# Altium footprint library SpaceVNX.PcbLib: 61 footprints (part 2 of 4)
Each footprint in its own frame and in the unit in brackets; x right, y up, seen from the top. Pads: shape width x height; smd on the part's side, far side on the other; paste and mask are expansions set on the pad; w line width, h text height; cw(c..) or ccw(c..) is an arc to the next point about the centre after c.
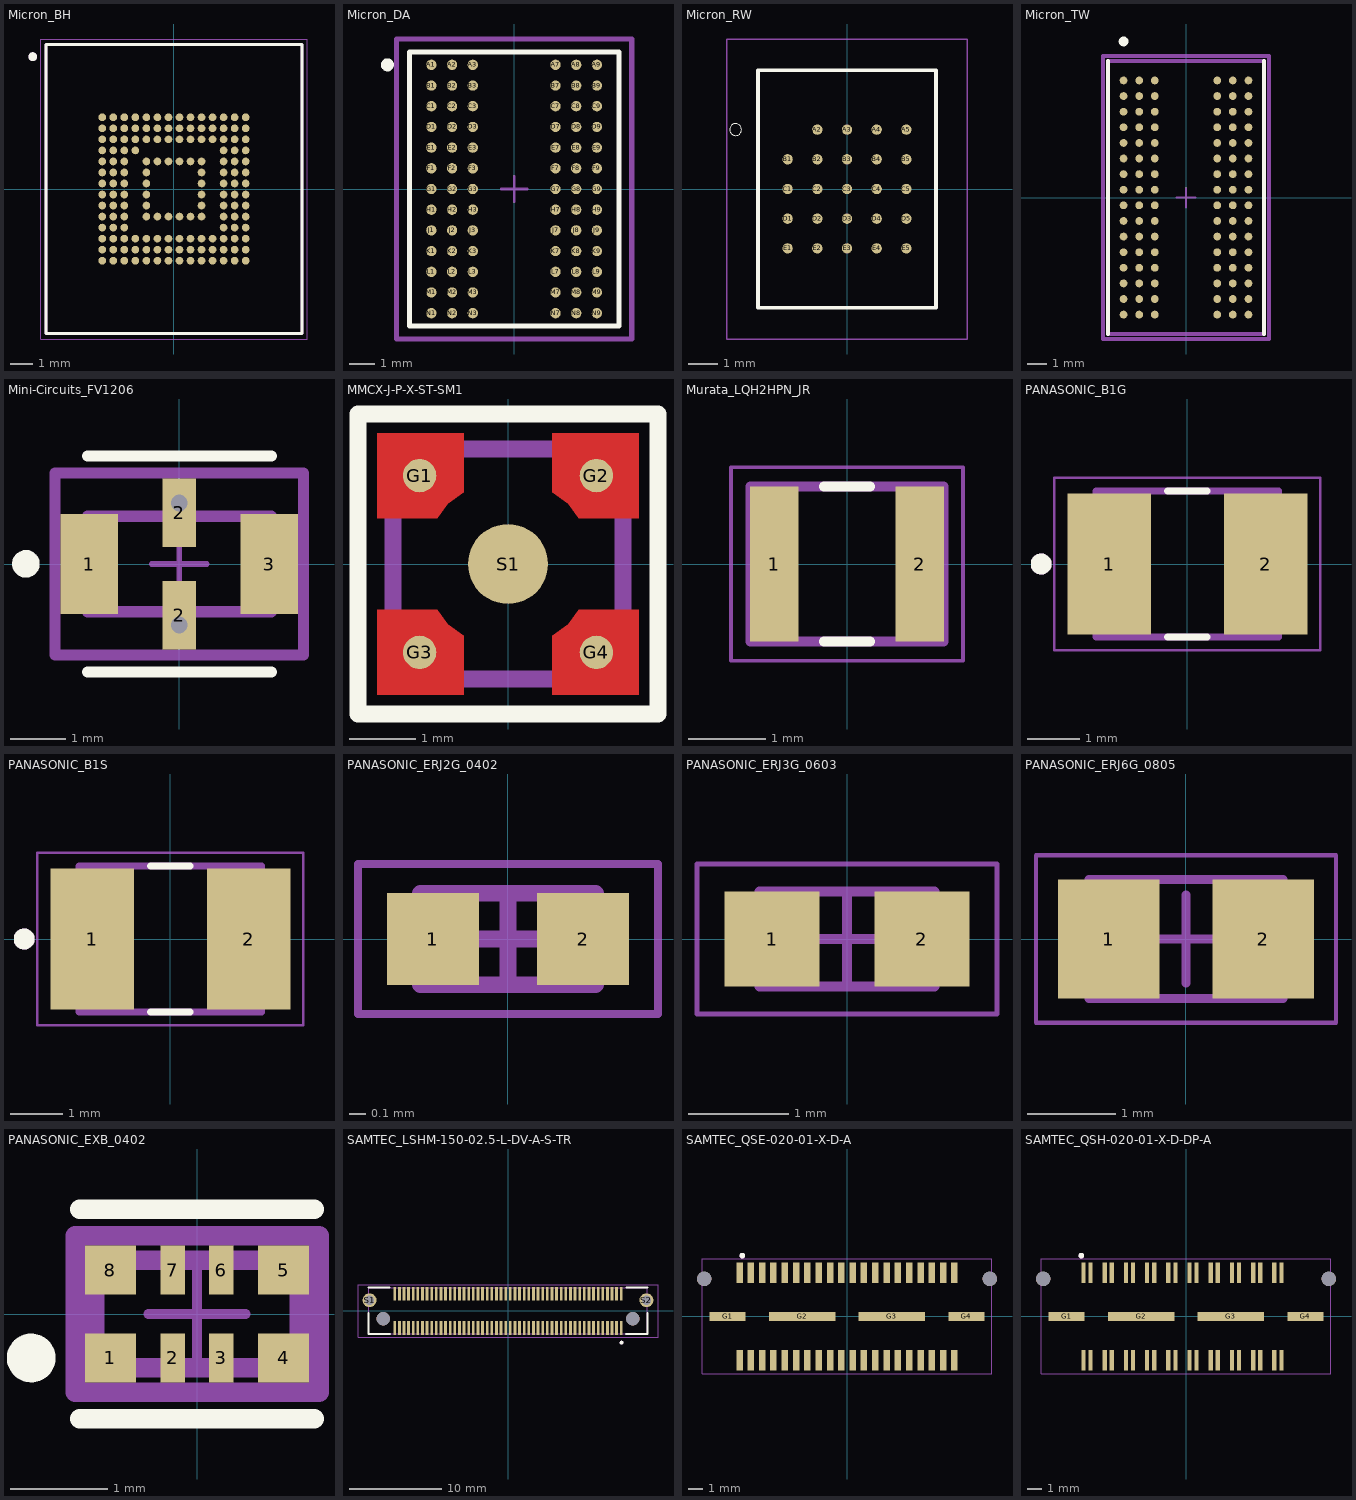
[diagram p1: the footprints below, top view; thin cyan lines are the x and y axes]

## Micron_BH [mm] "153-Ball TFBGA 11.5 x 13 mm"
pads (153):
  round 0.35 smd: A1(-3.25,3.25) A2(-2.75,3.25) A3(-2.25,3.25) A4(-1.75,3.25) A5(-1.25,3.25) A6(-0.75,3.25) A7(-0.25,3.25) A8(0.25,3.25) A9(0.75,3.25) A10(1.25,3.25) A11(1.75,3.25) A12(2.25,3.25) A13(2.75,3.25) A14(3.25,3.25) B1(-3.25,2.75) B2(-2.75,2.75) B3(-2.25,2.75) B4(-1.75,2.75) B5(-1.25,2.75) B6(-0.75,2.75) B7(-0.25,2.75) B8(0.25,2.75) B9(0.75,2.75) B10(1.25,2.75) B11(1.75,2.75) B12(2.25,2.75) B13(2.75,2.75) B14(3.25,2.75) C1(-3.25,2.25) C2(-2.75,2.25) C3(-2.25,2.25) C4(-1.75,2.25) C5(-1.25,2.25) C6(-0.75,2.25) C7(-0.25,2.25) C8(0.25,2.25) C9(0.75,2.25) C10(1.25,2.25) C11(1.75,2.25) C12(2.25,2.25) C13(2.75,2.25) C14(3.25,2.25) D1(-3.25,1.75) D2(-2.75,1.75) D3(-2.25,1.75) D4(-1.75,1.75) D12(2.25,1.75) D13(2.75,1.75) D14(3.25,1.75) E1(-3.25,1.25) E2(-2.75,1.25) E3(-2.25,1.25) E5(-1.25,1.25) E6(-0.75,1.25) E7(-0.25,1.25) E8(0.25,1.25) E9(0.75,1.25) E10(1.25,1.25) E12(2.25,1.25) E13(2.75,1.25) E14(3.25,1.25) F1(-3.25,0.75) F2(-2.75,0.75) F3(-2.25,0.75) F5(-1.25,0.75) F10(1.25,0.75) F12(2.25,0.75) F13(2.75,0.75) F14(3.25,0.75) G1(-3.25,0.25) G2(-2.75,0.25) G3(-2.25,0.25) G5(-1.25,0.25) G10(1.25,0.25) G12(2.25,0.25) G13(2.75,0.25) G14(3.25,0.25) H1(-3.25,-0.25) H2(-2.75,-0.25) H3(-2.25,-0.25) H5(-1.25,-0.25) H10(1.25,-0.25) H12(2.25,-0.25) H13(2.75,-0.25) H14(3.25,-0.25) J1(-3.25,-0.75) J2(-2.75,-0.75) J3(-2.25,-0.75) J5(-1.25,-0.75) J10(1.25,-0.75) J12(2.25,-0.75) J13(2.75,-0.75) J14(3.25,-0.75) K1(-3.25,-1.25) K2(-2.75,-1.25) K3(-2.25,-1.25) K5(-1.25,-1.25) K6(-0.75,-1.25) K7(-0.25,-1.25) K8(0.25,-1.25) K9(0.75,-1.25) K10(1.25,-1.25) K12(2.25,-1.25) K13(2.75,-1.25) K14(3.25,-1.25) L1(-3.25,-1.75) L2(-2.75,-1.75) L3(-2.25,-1.75) L12(2.25,-1.75) L13(2.75,-1.75) L14(3.25,-1.75) M1(-3.25,-2.25) M2(-2.75,-2.25) M3(-2.25,-2.25) M4(-1.75,-2.25) M5(-1.25,-2.25) M6(-0.75,-2.25) M7(-0.25,-2.25) M8(0.25,-2.25) M9(0.75,-2.25) M10(1.25,-2.25) M11(1.75,-2.25) M12(2.25,-2.25) M13(2.75,-2.25) M14(3.25,-2.25) N1(-3.25,-2.75) N2(-2.75,-2.75) N3(-2.25,-2.75) N4(-1.75,-2.75) N5(-1.25,-2.75) N6(-0.75,-2.75) N7(-0.25,-2.75) N8(0.25,-2.75) N9(0.75,-2.75) N10(1.25,-2.75) N11(1.75,-2.75) N12(2.25,-2.75) N13(2.75,-2.75) N14(3.25,-2.75) P1(-3.25,-3.25) P2(-2.75,-3.25) P3(-2.25,-3.25) P4(-1.75,-3.25) P5(-1.25,-3.25) P6(-0.75,-3.25) P7(-0.25,-3.25) P8(0.25,-3.25) P9(0.75,-3.25) P10(1.25,-3.25) P11(1.75,-3.25) P12(2.25,-3.25) P13(2.75,-3.25) P14(3.25,-3.25)
Top Overlay:
  circle w0.2: c-6.4,6 r0.1
  lines w0.127: -5.8,-6.55 -5.8,6.55 5.8,6.55 5.8,-6.55 -5.8,-6.55
Mechanical 13:
  circle w0.2: c-6.4,6 r0.1
  lines w0.127: -5.8,-6.55 -5.8,6.55 5.8,6.55 5.8,-6.55 -5.8,-6.55
Mechanical 15:
  lines w0.05: -6.05,-6.8 -6.05,6.8 6.05,6.8 6.05,-6.8 -6.05,-6.8
3D body "MICRON_BH.stp": height 0.85, standoff -0.25, extent -5.75,-6.5 5.75,6.5

## Micron_DA [mm] "78-Ball FBGA 8 x 10 mm"
pads (78):
  round 0.399 smd paste+0 mask+0: A1(-3.2,4.8) A2(-2.4,4.8) A3(-1.6,4.8) A7(1.6,4.8) A8(2.4,4.8) A9(3.2,4.8) B1(-3.2,4) B2(-2.4,4) B3(-1.6,4) B7(1.6,4) B8(2.4,4) B9(3.2,4) C1(-3.2,3.2) C2(-2.4,3.2) C3(-1.6,3.2) C7(1.6,3.2) C8(2.4,3.2) C9(3.2,3.2) D1(-3.2,2.4) D2(-2.4,2.4) D3(-1.6,2.4) D7(1.6,2.4) D8(2.4,2.4) D9(3.2,2.4) E1(-3.2,1.6) E2(-2.4,1.6) E3(-1.6,1.6) E7(1.6,1.6) E8(2.4,1.6) E9(3.2,1.6) F1(-3.2,0.8) F2(-2.4,0.8) F3(-1.6,0.8) F7(1.6,0.8) F8(2.4,0.8) F9(3.2,0.8) G1(-3.2,0) G2(-2.4,0) G3(-1.6,0) G7(1.6,0) G8(2.4,0) G9(3.2,0) H1(-3.2,-0.8) H2(-2.4,-0.8) H3(-1.6,-0.8) H7(1.6,-0.8) H8(2.4,-0.8) H9(3.2,-0.8) J1(-3.2,-1.6) J2(-2.4,-1.6) J3(-1.6,-1.6) J7(1.6,-1.6) J8(2.4,-1.6) J9(3.2,-1.6) K1(-3.2,-2.4) K2(-2.4,-2.4) K3(-1.6,-2.4) K7(1.6,-2.4) K8(2.4,-2.4) K9(3.2,-2.4) L1(-3.2,-3.2) L2(-2.4,-3.2) L3(-1.6,-3.2) L7(1.6,-3.2) L8(2.4,-3.2) L9(3.2,-3.2) M1(-3.2,-4) M2(-2.4,-4) M3(-1.6,-4) M7(1.6,-4) M8(2.4,-4) M9(3.2,-4) N1(-3.2,-4.8) N2(-2.4,-4.8) N3(-1.6,-4.8) N7(1.6,-4.8) N8(2.4,-4.8) N9(3.2,-4.8)
Top Overlay:
  circle w0.25: c-4.9,4.8 r0.125
  lines w0.2: -4.05,-5.3 -4.05,5.3 4.05,5.3 4.05,-5.3 -4.05,-5.3
Mechanical 10:
  lines w0.2: -4.55,-5.8 -4.55,5.8 4.55,5.8 4.55,-5.8 -4.55,-5.8
  text ".Designator" at 0,0 h1
Mechanical 12:
  lines w0.15: -4.05,-5.3 -4.05,5.3 4.05,5.3 4.05,-5.3 -4.05,-5.3
Mechanical 15:
  lines w0.1: -0.5,0 0.5,0 ; 0,-0.5 0,0.5
  lines w0.2: -4.55,-5.8 -4.55,5.8 4.55,5.8 4.55,-5.8 -4.55,-5.8
3D body "MICRON_DA.stp": height 1.07, standoff -0.15, extent -3.986,-5.253 4.014,5.247

## Micron_RW [mm] "24-Ball T-PBGA 6 x 8mm"
pads (24):
  round 0.35 smd: A2(-1,2) A3(0,2) A4(1,2) A5(2,2) B1(-2,1) B2(-1,1) B3(0,1) B4(1,1) B5(2,1) C1(-2,0) C2(-1,0) C3(0,0) C4(1,0) C5(2,0) D1(-2,-1) D2(-1,-1) D3(0,-1) D4(1,-1) D5(2,-1) E1(-2,-2) E2(-1,-2) E3(0,-2) E4(1,-2) E5(2,-2)
Top Overlay:
  circle w0: c-3.75,2 r0.2
  lines w0.127: -3,-4 3,-4 3,4 -3,4 -3,-4
Mechanical 15:
  lines w0.05: -4.05,-5.05 4.05,-5.05 4.05,5.05 -4.05,5.05 -4.05,-5.05
3D body "MICRON_RW.stp": height 1.1, standoff -0.1, extent -3,-4 3,4

## Micron_TW [mm] "96-Ball FBGA 8mm x 14 mm"
pads (96):
  round 0.399 smd paste+0 mask+0: A1(-3.2,6) A2(-2.4,6) A3(-1.6,6) A7(1.6,6) A8(2.4,6) A9(3.2,6) B1(-3.2,5.2) B2(-2.4,5.2) B3(-1.6,5.2) B7(1.6,5.2) B8(2.4,5.2) B9(3.2,5.2) C1(-3.2,4.4) C2(-2.4,4.4) C3(-1.6,4.4) C7(1.6,4.4) C8(2.4,4.4) C9(3.2,4.4) D1(-3.2,3.6) D2(-2.4,3.6) D3(-1.6,3.6) D7(1.6,3.6) D8(2.4,3.6) D9(3.2,3.6) E1(-3.2,2.8) E2(-2.4,2.8) E3(-1.6,2.8) E7(1.6,2.8) E8(2.4,2.8) E9(3.2,2.8) F1(-3.2,2) F2(-2.4,2) F3(-1.6,2) F7(1.6,2) F8(2.4,2) F9(3.2,2) G1(-3.2,1.2) G2(-2.4,1.2) G3(-1.6,1.2) G7(1.6,1.2) G8(2.4,1.2) G9(3.2,1.2) H1(-3.2,0.4) H2(-2.4,0.4) H3(-1.6,0.4) H7(1.6,0.4) H8(2.4,0.4) H9(3.2,0.4) J1(-3.2,-0.4) J2(-2.4,-0.4) J3(-1.6,-0.4) J7(1.6,-0.4) J8(2.4,-0.4) J9(3.2,-0.4) K1(-3.2,-1.2) K2(-2.4,-1.2) K3(-1.6,-1.2) K7(1.6,-1.2) K8(2.4,-1.2) K9(3.2,-1.2) L1(-3.2,-2) L2(-2.4,-2) L3(-1.6,-2) L7(1.6,-2) L8(2.4,-2) L9(3.2,-2) M1(-3.2,-2.8) M2(-2.4,-2.8) M3(-1.6,-2.8) M7(1.6,-2.8) M8(2.4,-2.8) M9(3.2,-2.8) N1(-3.2,-3.6) N2(-2.4,-3.6) N3(-1.6,-3.6) N7(1.6,-3.6) N8(2.4,-3.6) N9(3.2,-3.6) P1(-3.2,-4.4) P2(-2.4,-4.4) P3(-1.6,-4.4) P7(1.6,-4.4) P8(2.4,-4.4) P9(3.2,-4.4) R1(-3.2,-5.2) R2(-2.4,-5.2) R3(-1.6,-5.2) R7(1.6,-5.2) R8(2.4,-5.2) R9(3.2,-5.2) T1(-3.2,-6) T2(-2.4,-6) T3(-1.6,-6) T7(1.6,-6) T8(2.4,-6) T9(3.2,-6)
Top Overlay:
  circle w0.25: c-3.2,8 r0.125
  lines w0.2: -4,-7 -4,7 ; 4,-7 4,7
Mechanical 10:
  lines w0.2: -4.25,-7.25 4.25,-7.25 4.25,7.25 -4.25,7.25 -4.25,-7.25
  text ".Designator" at -4.318,-7.112 h1
Mechanical 12:
  lines w0.2: -4,-7 4,-7 4,7 -4,7 -4,-7
Mechanical 15:
  lines w0.1: -0.5,0 0.5,0 ; 0,-0.5 0,0.5
  lines w0.2: -4.25,-7.25 4.25,-7.25 4.25,7.25 -4.25,7.25 -4.25,-7.25
3D body "MICRON_TW.stp": height 1.21, standoff -0.09, extent -4,-7 4,7

## Mini-Circuits_FV1206 [mil] "3.2 X 1.6 mm Ceramic Body, 0.94 mm Height"
pads (4):
  rect 41x71 smd paste+0 mask+0: 1(-64,0) 3(64,0)
  rect 24x49 smd paste+0 mask+0: 2(0,-36.5) 2(0,36.5)
via 0,-43.5 diameter 24 hole 12
via 0,43.5 diameter 24 hole 12
Top Overlay:
  circle w9.84: c-109.26,0.07 r4.92
  lines w7.87: -65.5,-76.77 65.5,-76.77 ; -65.5,76.77 65.5,76.77
Mechanical 10:
  lines w7.87: -88.44,-64.94 -88.44,64.94 88.44,64.94 88.44,-64.94 -88.44,-64.94
  text ".Designator" at 0,7.39 h39.37
Mechanical 12:
  lines w7.87: -65.5,-34 -65.5,34 65.5,34 65.5,-34 -65.5,-34
Mechanical 15:
  lines w3.94: -19.68,0 19.68,0 ; 0,-19.68 0,19.68
  lines w7.87: -88.44,-64.94 -88.44,64.94 88.44,64.94 88.44,-64.94 -88.44,-64.94
3D body "Filter_Mini-Circuits_LFCN-2500+_eec.STEP": height 10, standoff 0, extent -88.44,-64.94 88.44,64.94

## MMCX-J-P-X-ST-SM1 [mm]
pads (5):
  round 0.5 smd: G1(-1.325,1.325) G2(1.325,1.325) G3(-1.325,-1.325) G4(1.325,-1.325)
  round 1.2 smd mask+0.05: S1(0,0)
Top Layer:
  region: -1.059,0.688 -1.962,0.688 -1.962,1.962 -0.663,1.962 -0.667,1.08 -0.901,0.901 -1.062,0.69
  region: 1.059,0.688 1.962,0.688 1.962,1.962 0.663,1.962 0.667,1.08 0.901,0.901 1.062,0.69
  region: -1.059,-0.688 -1.962,-0.688 -1.962,-1.962 -0.663,-1.962 -0.667,-1.08 -0.901,-0.901 -1.062,-0.69
  region: 1.059,-0.688 1.962,-0.688 1.962,-1.962 0.663,-1.962 0.667,-1.08 0.901,-0.901 1.062,-0.69
Top Overlay:
  lines w0.254: -2.25,-2.25 2.25,-2.25 2.25,2.25 -2.25,2.25 -2.25,-2.25
Top Paste:
  region: -1.059,0.688 -1.962,0.688 -1.962,1.962 -0.663,1.962 -0.667,1.08 -0.901,0.901 -1.062,0.69
  region: 1.059,0.688 1.962,0.688 1.962,1.962 0.663,1.962 0.667,1.08 0.901,0.901 1.062,0.69
  region: -1.059,-0.688 -1.962,-0.688 -1.962,-1.962 -0.663,-1.962 -0.667,-1.08 -0.901,-0.901 -1.062,-0.69
  region: 1.059,-0.688 1.962,-0.688 1.962,-1.962 0.663,-1.962 0.667,-1.08 0.901,-0.901 1.062,-0.69
Top Solder:
  region: -1.017,0.613 -2.037,0.613 -2.037,2.037 -0.588,2.037 -0.593,1.04 -0.599,1.037 -0.847,0.847 -1.025,0.616
  region: 1.017,0.613 2.037,0.613 2.037,2.037 0.588,2.037 0.593,1.04 0.599,1.037 0.847,0.847 1.025,0.616
  region: -1.017,-0.613 -2.037,-0.613 -2.037,-2.037 -0.588,-2.037 -0.593,-1.04 -0.599,-1.037 -0.847,-0.847 -1.025,-0.616
  region: 1.017,-0.613 2.037,-0.613 2.037,-2.037 0.588,-2.037 0.593,-1.04 0.599,-1.037 0.847,-0.847 1.025,-0.616
Mechanical 1:
  lines w0.254: -1.725,-1.725 1.725,-1.725 1.725,1.725 -1.725,1.725 -1.725,-1.725
  text "J1" at -0.37,-0.377 h0.5
3D body "MMCX-J-P-H-ST-SM1.stp": height 5, standoff 0, extent -1.725,-1.75 1.725,1.75

## Murata_LQH2HPN_JR [mm] "1008 (2520)"
pads (2):
  rect 0.625x2 smd: 1(-0.937,0) 2(0.937,0)
Top Overlay:
  lines w0.127: -0.3,-1 0.3,-1 ; -0.3,1 0.3,1
Mechanical 13:
  lines w0.127: -1.25,-1 1.25,-1 1.25,1 -1.25,1 -1.25,-1
Mechanical 15:
  lines w0.05: -1.5,-1.25 1.5,-1.25 1.5,1.25 -1.5,1.25 -1.5,-1.25
3D body "LQH2HP_J0.stp": height 1.1, standoff 0, extent -1.25,-1 1.25,1

## PANASONIC_B1G [mm]
pads (2):
  rect 1.6x2.7 smd: 1(-1.5,0) 2(1.5,0)
Top Overlay:
  circle w0.2: c-2.8,0 r0.1
  lines w0.127: -0.38,-1.4 0.38,-1.4 ; -0.38,1.4 0.38,1.4
Mechanical 13:
  circle w0.2: c-2.8,0 r0.1
  lines w0.127: -1.75,-1.4 1.75,-1.4 1.75,1.4 -1.75,1.4 -1.75,-1.4
Mechanical 15:
  lines w0.05: -2.55,-1.65 2.55,-1.65 2.55,1.65 -2.55,1.65 -2.55,-1.65
3D body "B1G.stp": height 1.05, standoff -0.05, extent -1.778,-1.4 1.722,1.4

## PANASONIC_B1S [mm]
pads (2):
  rect 1.6x2.7 smd: 1(-1.5,0) 2(1.5,0)
Top Overlay:
  circle w0.2: c-2.8,0 r0.1
  lines w0.127: -0.38,-1.4 0.38,-1.4 ; -0.38,1.4 0.38,1.4
Mechanical 13:
  circle w0.2: c-2.8,0 r0.1
  lines w0.127: -1.75,-1.4 -1.75,1.4 1.75,1.4 1.75,-1.4 -1.75,-1.4
Mechanical 15:
  lines w0.05: -2.55,-1.65 -2.55,1.65 2.55,1.65 2.55,-1.65 -2.55,-1.65
3D body "B1S.stp": height 1.05, standoff -0.05, extent -1.75,-1.4 1.75,1.4

## PANASONIC_ERJ2G_0402 [mm] "Chip Resistor, 2-Leads, Body 1,00x0,50mm, IPC Medium Density"
height 0.4
pads (2):
  rect 0.55x0.55 smd: 1(-0.45,0) 2(0.45,0)
Mechanical 13:
  lines w0.1: -0.525,-0.275 0.525,-0.275 0.525,0.275 -0.525,0.275 -0.525,-0.275
Mechanical 15:
  lines w0.05: -0.9,-0.45 0.9,-0.45 0.9,0.45 -0.9,0.45 -0.9,-0.45
  lines w0.1: -0.275,0 0.275,0 ; 0,-0.275 0,0.275
3D body "ERJ2G_0402.STEP": height 0.36, standoff 0, extent -0.5,-0.25 0.5,0.25

## PANASONIC_ERJ3G_0603 [mm] "Chip Resistor, 2-Leads, Body 1,60x0,85mm, IPC Medium Density"
height 0.55
pads (2):
  rect 0.95x0.95 smd: 1(-0.75,0) 2(0.75,0)
Mechanical 13:
  lines w0.1: -0.875,-0.475 -0.875,0.475 0.875,0.475 0.875,-0.475 -0.875,-0.475
Mechanical 15:
  lines w0.05: -1.5,-0.75 -1.5,0.75 1.5,0.75 1.5,-0.75 -1.5,-0.75
  lines w0.1: -0.475,0 0.475,0 ; 0,-0.475 0,0.475
3D body "ERJ3G_0603.STEP": height 0.46, standoff 0, extent -0.775,-0.425 0.775,0.425

## PANASONIC_ERJ6G_0805 [mm] "Chip Resistor, 2-Leads, Body 2,00x1,25mm, IPC Medium Density"
height 0.7
pads (2):
  rect 1.15x1.35 smd: 1(-0.875,0) 2(0.875,0)
Mechanical 13:
  lines w0.1: -1.1,-0.675 1.1,-0.675 1.1,0.675 -1.1,0.675 -1.1,-0.675
Mechanical 15:
  lines w0.05: -1.7,-0.95 1.7,-0.95 1.7,0.95 -1.7,0.95 -1.7,-0.95
  lines w0.1: -0.5,0 0.5,0 ; 0,-0.5 0,0.5
3D body "ERJ6G_0805.STEP": height 0.45, standoff 0, extent -1,-0.625 1,0.625

## PANASONIC_EXB_0402 [mm] "4 resistors in 2.0 mm x 1.0 mm size / 0804 inch size"
pads (8):
  rect 0.525x0.5 smd paste+0 mask+0: 1(-0.887,-0.45) 4(0.887,-0.45) 5(0.887,0.45) 8(-0.887,0.45)
  rect 0.25x0.5 smd paste+0 mask+0: 2(-0.25,-0.45) 3(0.25,-0.45) 6(0.25,0.45) 7(-0.25,0.45)
Top Overlay:
  circle w0.25: c-1.7,-0.45 r0.125
  lines w0.2: -1.2,-1.075 1.2,-1.075 ; -1.2,1.075 1.2,1.075
Mechanical 10:
  lines w0.2: -1.25,-0.8 1.25,-0.8 1.25,0.8 -1.25,0.8 -1.25,-0.8
  text ".Designator" at -1.143,-0.32 h1
Mechanical 12:
  lines w0.2: -1.05,-0.55 1.05,-0.55 1.05,0.55 -1.05,0.55 -1.05,-0.55
Mechanical 15:
  lines w0.1: -0.5,0 0.5,0 ; 0,-0.5 0,0.5
  lines w0.2: -1.25,-0.8 1.25,-0.8 1.25,0.8 -1.25,0.8 -1.25,-0.8
3D body "Res_Panasonic_-_ECG_EXB-28V330JX_eec.STEP": height 0.25, standoff 0, extent -1.25,-0.8 1.25,0.8

## SAMTEC_LSHM-150-02.5-L-DV-A-S-TR [mm]
pads (104):
  rect 0.3x1.5 smd: 1(12.25,-1.85) 2(12.25,1.85) 3(11.75,-1.85) 4(11.75,1.85) 5(11.25,-1.85) 6(11.25,1.85) 7(10.75,-1.85) 8(10.75,1.85) 9(10.25,-1.85) 10(10.25,1.85) 11(9.75,-1.85) 12(9.75,1.85) 13(9.25,-1.85) 14(9.25,1.85) 15(8.75,-1.85) 16(8.75,1.85) 17(8.25,-1.85) 18(8.25,1.85) 19(7.75,-1.85) 20(7.75,1.85) 21(7.25,-1.85) 22(7.25,1.85) 23(6.75,-1.85) 24(6.75,1.85) 25(6.25,-1.85) 26(6.25,1.85) 27(5.75,-1.85) 28(5.75,1.85) 29(5.25,-1.85) 30(5.25,1.85) 31(4.75,-1.85) 32(4.75,1.85) 33(4.25,-1.85) 34(4.25,1.85) 35(3.75,-1.85) 36(3.75,1.85) 37(3.25,-1.85) 38(3.25,1.85) 39(2.75,-1.85) 40(2.75,1.85) 41(2.25,-1.85) 42(2.25,1.85) 43(1.75,-1.85) 44(1.75,1.85) 45(1.25,-1.85) 46(1.25,1.85) 47(0.75,-1.85) 48(0.75,1.85) 49(0.25,-1.85) 50(0.25,1.85) 51(-0.25,-1.85) 52(-0.25,1.85) 53(-0.75,-1.85) 54(-0.75,1.85) 55(-1.25,-1.85) 56(-1.25,1.85) 57(-1.75,-1.85) 58(-1.75,1.85) 59(-2.25,-1.85) 60(-2.25,1.85) 61(-2.75,-1.85) 62(-2.75,1.85) 63(-3.25,-1.85) 64(-3.25,1.85) 65(-3.75,-1.85) 66(-3.75,1.85) 67(-4.25,-1.85) 68(-4.25,1.85) 69(-4.75,-1.85) 70(-4.75,1.85) 71(-5.25,-1.85) 72(-5.25,1.85) 73(-5.75,-1.85) 74(-5.75,1.85) 75(-6.25,-1.85) 76(-6.25,1.85) 77(-6.75,-1.85) 78(-6.75,1.85) 79(-7.25,-1.85) 80(-7.25,1.85) 81(-7.75,-1.85) 82(-7.75,1.85) 83(-8.25,-1.85) 84(-8.25,1.85) 85(-8.75,-1.85) 86(-8.75,1.85) 87(-9.25,-1.85) 88(-9.25,1.85) 89(-9.75,-1.85) 90(-9.75,1.85) 91(-10.25,-1.85) 92(-10.25,1.85) 93(-10.75,-1.85) 94(-10.75,1.85) 95(-11.25,-1.85) 96(-11.25,1.85) 97(-11.75,-1.85) 98(-11.75,1.85) 99(-12.25,-1.85) 100(-12.25,1.85)
  round 1.5 hole 1: S1(-14.975,1.15) S2(14.975,1.15)
  round 1.45 hole 1.45 unplated: ""(-13.5,-0.85) ""(13.5,-0.85)
Top Overlay:
  circle w0.2: c12.279,-3.429 r0.1
  lines w0.2: -15.075,-0.3 -15.075,-2.49 ; -15.075,-0.2 -15.075,-2.49 ; -15.075,2.51 -12.8,2.51 ; -12.8,-2.49 -15.075,-2.49 ; -12.75,-2.49 -15.075,-2.49 ; 12.75,-2.49 15.075,-2.49 ; 12.8,2.51 15.075,2.51 ; 15.075,-0.3 15.075,-2.49 ; 15.075,-0.2 15.075,-2.49
Top Paste:
  circle w1: c14.975,1.15 r0.5
  circle w1: c-14.975,1.15 r0.5
Mechanical 13:
  circle w0.2: c12.279,-3.429 r0.1
  lines w0.1: -15.075,-2.49 15.075,-2.49 15.075,2.49 -15.075,2.49 -15.075,-2.49
Mechanical 15:
  lines w0.05: -16.225,-2.85 16.225,-2.85 16.225,2.85 -16.225,2.85 -16.225,-2.85
3D body "LSHM-150-02.5-L-DV-A-S-TR.stp": height 3.8, standoff -1.8, extent -15.401,-2.49 15.401,2.54

## SAMTEC_QSE-020-01-X-D-A [mm]
pads (46):
  rect 0.46x1.45 smd: 01(-7.6,3.09) 02(-7.6,-3.09) 03(-6.8,3.09) 04(-6.8,-3.09) 05(-6,3.09) 06(-6,-3.09) 07(-5.2,3.09) 08(-5.2,-3.09) 09(-4.4,3.09) 10(-4.4,-3.09) 11(-3.6,3.09) 12(-3.6,-3.09) 13(-2.8,3.09) 14(-2.8,-3.09) 15(-2,3.09) 16(-2,-3.09) 17(-1.2,3.09) 18(-1.2,-3.09) 19(-0.4,3.09) 20(-0.4,-3.09) 21(0.4,3.09) 22(0.4,-3.09) 23(1.2,3.09) 24(1.2,-3.09) 25(2,3.09) 26(2,-3.09) 27(2.8,3.09) 28(2.8,-3.09) 29(3.6,3.09) 30(3.6,-3.09) 31(4.4,3.09) 32(4.4,-3.09) 33(5.2,3.09) 34(5.2,-3.09) 35(6,3.09) 36(6,-3.09) 37(6.8,3.09) 38(6.8,-3.09) 39(7.6,3.09) 40(7.6,-3.09)
  rect 2.54x0.64 smd: G1(-8.445,0) G4(8.445,0)
  rect 4.7x0.64 smd: G2(-3.175,0) G3(3.175,0)
  round 1.02 hole 1.02 unplated: ""(-10.1,2.65) ""(10.1,2.65)
Top Overlay:
  circle w0.2: c-7.4,4.3 r0.1
Mechanical 13:
  circle w0.2: c-7.4,4.3 r0.1
Mechanical 15:
  lines w0.05: -10.25,-4.065 10.25,-4.065 10.25,4.065 -10.25,4.065 -10.25,-4.065
3D body "QSE-020-01-F-D-A.stp": height 3.05, standoff -0.97, extent -10.642,-3.746 10.643,3.747

## SAMTEC_QSH-020-01-X-D-DP-A [mm]
pads (46):
  rect 0.3x1.45 smd: 01(-7.25,3.09) 02(-7.25,-3.09) 03(-6.75,3.09) 04(-6.75,-3.09) 05(-5.75,3.09) 06(-5.75,-3.09) 07(-5.25,3.09) 08(-5.25,-3.09) 09(-4.25,3.09) 10(-4.25,-3.09) 11(-3.75,3.09) 12(-3.75,-3.09) 13(-2.75,3.09) 14(-2.75,-3.09) 15(-2.25,3.09) 16(-2.25,-3.09) 17(-1.25,3.09) 18(-1.25,-3.09) 19(-0.75,3.09) 20(-0.75,-3.09) 21(0.25,3.09) 22(0.25,-3.09) 23(0.75,3.09) 24(0.75,-3.09) 25(1.75,3.09) 26(1.75,-3.09) 27(2.25,3.09) 28(2.25,-3.09) 29(3.25,3.09) 30(3.25,-3.09) 31(3.75,3.09) 32(3.75,-3.09) 33(4.75,3.09) 34(4.75,-3.09) 35(5.25,3.09) 36(5.25,-3.09) 37(6.25,3.09) 38(6.25,-3.09) 39(6.75,3.09) 40(6.75,-3.09)
  rect 2.54x0.64 smd: G1(-8.445,0) G4(8.445,0)
  rect 4.7x0.64 smd: G2(-3.175,0) G3(3.175,0)
  round 1.02 hole 1.02 unplated: ""(-10.1,2.65) ""(10.1,2.65)
Top Overlay:
  circle w0.2: c-7.4,4.3 r0.1
Mechanical 13:
  circle w0.2: c-7.4,4.3 r0.1
Mechanical 15:
  lines w0.05: -10.25,-4.065 -10.25,4.065 10.25,4.065 10.25,-4.065 -10.25,-4.065
3D body "QSH-020-01-F-D-DP-A.stp": height 3.05, standoff -0.95, extent -10.655,-3.747 10.655,3.747